# Altium footprint library SparkFun.PCBLIB: 674 footprints (part 12 of 44)
Each footprint in its own frame and in the unit in brackets; x right, y up, seen from the top. Pads: shape width x height; smd on the part's side, far side on the other; paste and mask are expansions set on the pad; w line width, h text height; cw(c..) or ccw(c..) is an arc to the next point about the centre after c.
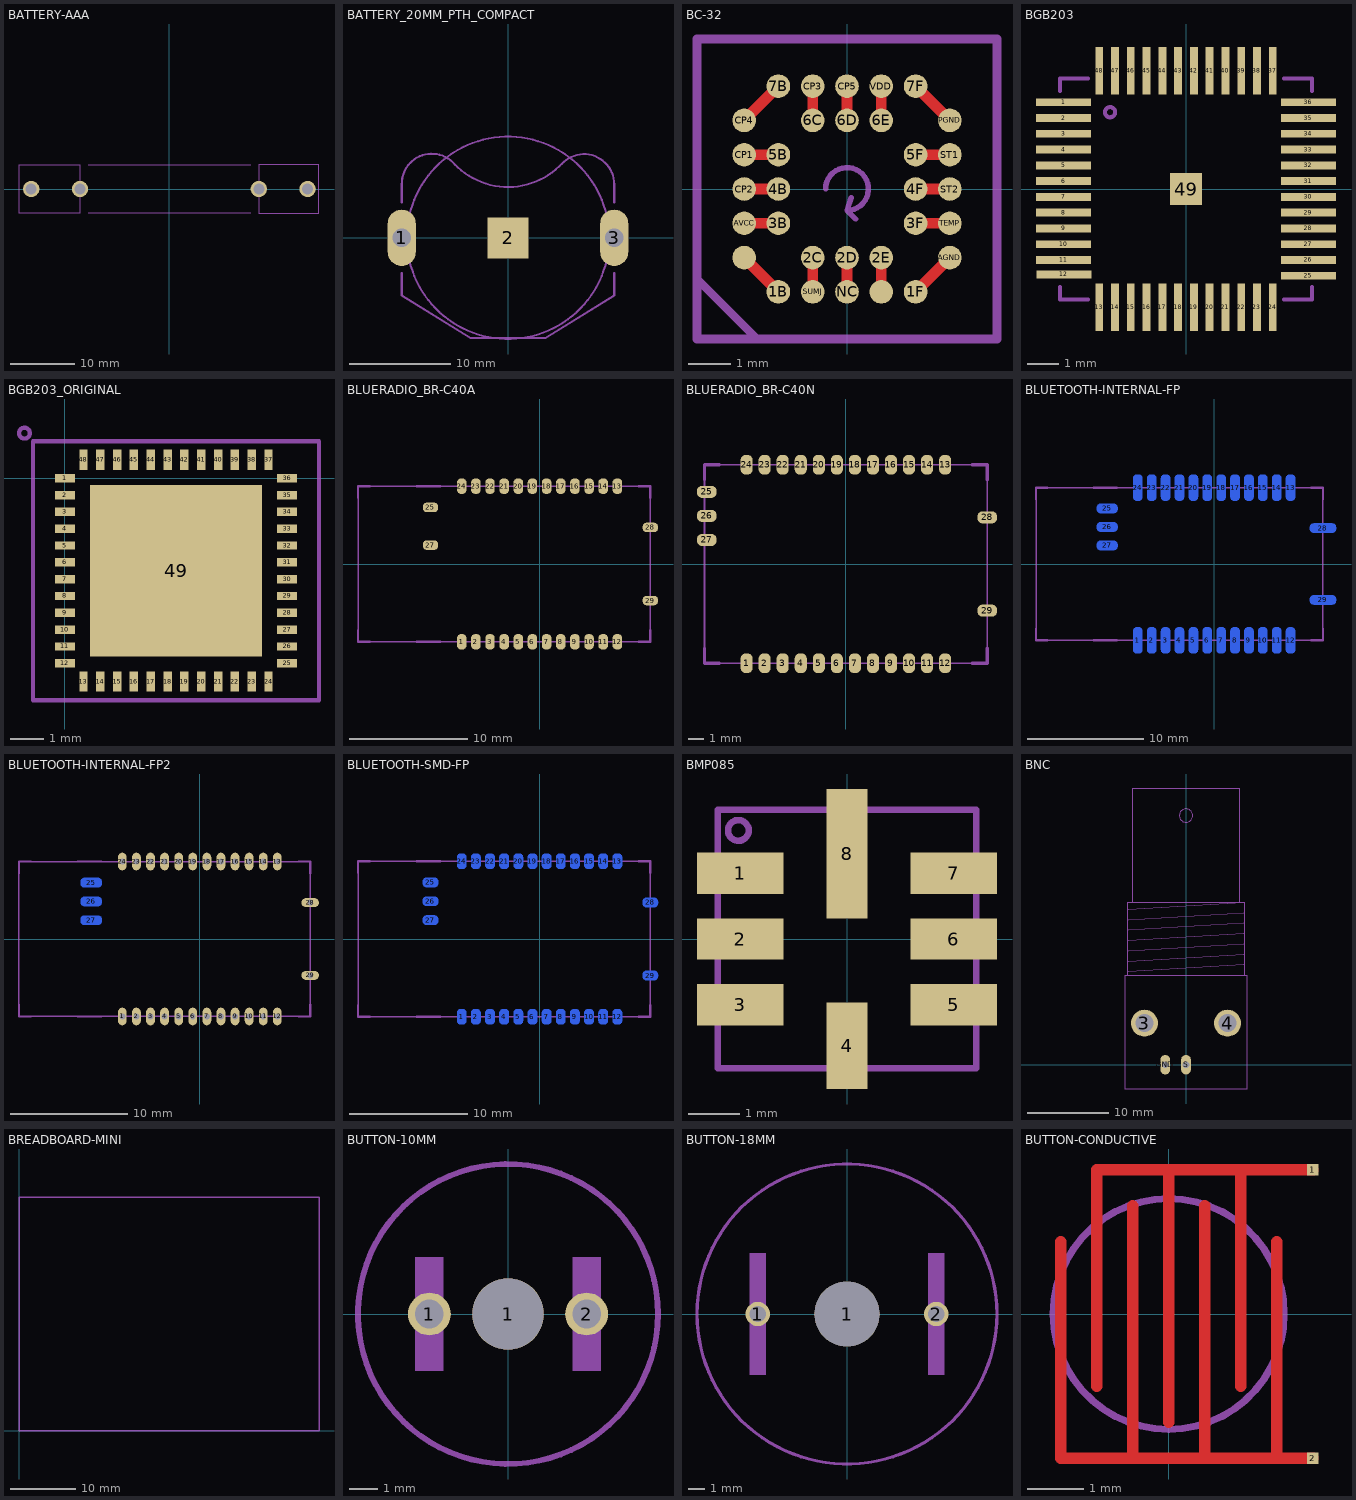
[diagram p11: the footprints below, top view; thin cyan lines are the x and y axes]

## BATTERY-AAA [mil]
pads (4):
  round 100.5 hole 67: GND@1(850,0) GND@2(550,0) PWR@1(-850,0) PWR@2(-550,0)
Mechanical 18:
  lines w5: -500,-150 500,-150 ; -500,150 500,150 ; -925,-150 -550,-150 -550,150 -925,150 -925,-150 ; 550,-150 550,150 920,150 920,-150 550,-150

## BATTERY_20MM_PTH_COMPACT [mil]
pads (3):
  oval 109.5x219 hole 73: 1(-413.39,0) 3(413.39,0)
  rect 160x160 smd: 2(0,0)
Mechanical 2:
  lines w8: -413.39,-137.8 -413.39,-224.41 -145.67,-389.76 145.67,-389.76 413.39,-224.41 413.39,-137.8 ; -413.39,137.8 -413.39,208.66 cw(c-296.55,210.4) -208.66,287.4 ccw(c0.13,485.68) 212.6,291.34 ; 208.66,287.4 cw(c295.52,207.71) 413.39,208.66 413.39,137.8
Mechanical 18:
  circle w8: c0,0 r393.7

## BC-32 [mil]
pads (32):
  rrect100% 21.65x21.65 smd: 1B(-62.99,-94.49) 1F(62.99,-94.49) 2C(-31.5,-62.99) 2D(0,-62.99) 2E(31.5,-62.99) 3B(-62.99,-31.5) 3F(62.99,-31.5) 4B(-62.99,0) 4F(62.99,0) 5B(-62.99,31.5) 5F(62.99,31.5) 6C(-31.5,62.99) 6D(0,62.99) 6E(31.5,62.99) 7B(-62.99,94.49) 7F(62.99,94.49) AGND(94.49,-62.99) AVCC(-94.49,-31.5) CP1(-94.49,31.5) CP2(-94.49,0) CP3(-31.5,94.49) CP4(-94.49,62.99) CP5(0,94.49) NC(0,-94.49) PGND(94.49,62.99) RATEOUT(-94.49,-62.99) ST1(94.49,31.5) ST2(94.49,0) SUMJ(-31.5,-94.49) TEMP(94.49,-31.5) VDD(31.5,94.49) VRATIO(31.5,-94.49)
Top Layer:
  lines w10: -94.49,-62.99 -62.99,-94.49 ; -94.49,-31.5 -62.99,-31.5 ; -94.49,0 -62.99,0 ; -94.49,31.5 -62.99,31.5 ; -94.49,62.99 -62.99,94.49 ; -31.5,-94.49 -31.5,-62.99 ; -31.5,62.99 -31.5,94.49 ; 0,-94.49 0,-62.99 ; 0,62.99 0,94.49 ; 31.5,-96.46 31.5,-62.99 ; 31.5,62.99 31.5,96.46 ; 61.02,0 94.49,0 ; 62.99,-94.49 94.49,-62.99 ; 62.99,-31.5 94.49,-31.5 ; 62.99,31.5 94.49,31.5 ; 62.99,94.49 94.49,62.99
Mechanical 2:
  lines w8: -137.8,-82.68 -82.68,-137.8 -78.74,-137.8 ; -137.8,-82.68 -137.8,137.8 137.8,137.8 137.8,-137.8 -78.74,-137.8 ; -137.8,-82.68 -137.8,-137.8 -78.74,-137.8
Mechanical 18:
  lines w5: -19.69,0 cw(c0,0) 0,-19.69 ; 3.94,-7.87 0,-19.69 ; 7.87,-27.56 0,-19.69 ; -137.8,-137.8 -137.8,137.8 137.8,137.8 137.8,-137.8 -137.8,-137.8

## BGB203 [mm]
pads (49):
  rect 1.75x0.25 smd: 1(-3.88,2.75) 2(-3.88,2.25) 3(-3.88,1.75) 4(-3.88,1.25) 5(-3.88,0.75) 6(-3.88,0.25) 7(-3.88,-0.25) 8(-3.88,-0.75) 9(-3.88,-1.25) 10(-3.88,-1.75) 11(-3.88,-2.25) 12(-3.87,-2.71) 25(3.88,-2.75) 26(3.88,-2.25) 27(3.88,-1.75) 28(3.88,-1.25) 29(3.88,-0.75) 30(3.88,-0.25) 31(3.88,0.25) 32(3.88,0.75) 33(3.88,1.25) 34(3.88,1.75) 35(3.88,2.25) 36(3.88,2.75)
  rect 0.25x1.5 smd: 13(-2.75,-3.75) 14(-2.25,-3.75) 15(-1.75,-3.75) 16(-1.25,-3.75) 17(-0.75,-3.75) 18(-0.25,-3.75) 19(0.25,-3.75) 20(0.75,-3.75) 21(1.25,-3.75) 22(1.75,-3.75) 23(2.25,-3.75) 24(2.75,-3.75) 37(2.75,3.75) 38(2.25,3.75) 39(1.75,3.75) 40(1.25,3.75) 41(0.75,3.75) 42(0.25,3.75) 43(-0.25,3.75) 44(-0.75,3.75) 45(-1.25,3.75) 46(-1.75,3.75) 47(-2.25,3.75) 48(-2.75,3.75)
  rect 1x1 smd paste-0.5: 49(0,0)
Top Paste:
  rectangle: -0.5,-0.5 0.5,0.5
Mechanical 2:
  circle w0.127: c-2.407,2.434 r0.161
  lines w0.127: -4,-3.1 -4,-3.5 -3.1,-3.5 ; -4,3.1 -4,3.5 -3.1,3.5 ; 3.1,-3.5 4,-3.5 4,-3.1 ; 3.1,3.5 4,3.5 4,3.1

## BGB203_ORIGINAL [mm]
pads (49):
  rect 0.6x0.25 smd mask-0.3: 1(0,0) 2(0,-0.5) 3(0,-1) 4(0,-1.5) 5(0,-2) 6(0,-2.5) 7(0,-3) 8(0,-3.5) 9(0,-4) 10(0,-4.5) 11(0,-5) 12(0,-5.5) 25(6.6,-5.5) 26(6.6,-5) 27(6.6,-4.5) 28(6.6,-4) 29(6.6,-3.5) 30(6.6,-3) 31(6.6,-2.5) 32(6.6,-2) 33(6.6,-1.5) 34(6.6,-1) 35(6.6,-0.5) 36(6.6,0)
  rect 0.25x0.6 smd mask-0.3: 13(0.55,-6.045) 14(1.05,-6.045) 15(1.55,-6.045) 16(2.05,-6.045) 17(2.55,-6.045) 18(3.05,-6.045) 19(3.55,-6.045) 20(4.05,-6.045) 21(4.55,-6.045) 22(5.05,-6.045) 23(5.55,-6.045) 24(6.05,-6.045) 37(6.05,0.55) 38(5.55,0.55) 39(5.05,0.55) 40(4.55,0.55) 41(4.05,0.55) 42(3.55,0.55) 43(3.05,0.55) 44(2.55,0.55) 45(2.05,0.55) 46(1.55,0.55) 47(1.05,0.55) 48(0.55,0.55)
  rect 5.1x5.1 smd paste-2.55 mask-2.55: 49(3.3,-2.75)
Top Paste:
  region: 0,0 0.254,0 0.254,0.254 0,0.254
  region: 0,0 0.254,0 0.254,0.254 0,0.254
  region: 0,0 0.254,0 0.254,0.254 0,0.254
  region: 0,0 0.254,0 0.254,0.254 0,0.254
Top Solder:
  drawing of 49 lines, arcs and shapes, not listed
Mechanical 2:
  circle w0.127: c-1.205,1.34 r0.161
  lines w0.127: -0.95,-6.595 -0.95,1.095 ; -0.95,1.1 7.55,1.1 7.55,0.3 ; -0.94,-6.595 7.55,-6.595 ; 7.55,-6.6 7.55,-6.595 ; 7.55,0.29 7.55,-6.595

## BLUERADIO_BR-C40A [mil]
pads (28):
  rrect80% 31.5x51.18 smd: 1(-259.84,-259.84) 2(-212.6,-259.84) 3(-165.35,-259.84) 4(-118.11,-259.84) 5(-70.87,-259.84) 6(-23.62,-259.84) 7(23.62,-259.84) 8(70.87,-259.84) 9(118.11,-259.84) 10(165.35,-259.84) 11(212.6,-259.84) 12(259.84,-259.84) 13(259.84,259.84) 14(212.6,259.84) 15(165.35,259.84) 16(118.11,259.84) 17(70.87,259.84) 18(23.62,259.84) 19(-23.62,259.84) 20(-70.87,259.84) 21(-118.11,259.84) 22(-165.35,259.84) 23(-212.6,259.84) 24(-259.84,259.84)
  rrect80% 51.18x31.5 smd: 25(-364.17,188.98) 27(-364.17,62.99) 28(370.08,122.05) 29(370.08,-122.05)
Mechanical 2:
  lines w8: -606.3,-220.47 -606.3,-259.84 -566.93,-259.84 ; -606.3,220.47 -606.3,259.84 -566.93,259.84 ; -409.45,-259.84 -370.08,-259.84 -330.71,-259.84 ; -409.45,259.84 -370.08,259.84 -330.71,259.84 ; 330.71,-259.84 370.08,-259.84 370.08,-220.47 ; 330.71,259.84 370.08,259.84 370.08,220.47
Mechanical 18:
  lines w5: -606.3,-259.84 -606.3,259.84 -370.08,259.84 370.08,259.84 370.08,-259.84 -370.08,-259.84 -606.3,-259.84

## BLUERADIO_BR-C40N [mil]
pads (29):
  rrect80% 31.5x51.18 smd: 1(-259.84,-259.84) 2(-212.6,-259.84) 3(-165.35,-259.84) 4(-118.11,-259.84) 5(-70.87,-259.84) 6(-23.62,-259.84) 7(23.62,-259.84) 8(70.87,-259.84) 9(118.11,-259.84) 10(165.35,-259.84) 11(212.6,-259.84) 12(259.84,-259.84) 13(259.84,259.84) 14(212.6,259.84) 15(165.35,259.84) 16(118.11,259.84) 17(70.87,259.84) 18(23.62,259.84) 19(-23.62,259.84) 20(-70.87,259.84) 21(-118.11,259.84) 22(-165.35,259.84) 23(-212.6,259.84) 24(-259.84,259.84)
  rrect80% 51.18x31.5 smd: 25(-364.17,188.98) 26(-364.17,125.98) 27(-364.17,62.99) 28(370.08,122.05) 29(370.08,-122.05)
Mechanical 2:
  lines w8: -370.08,-220.47 -370.08,-259.84 -330.71,-259.84 ; -370.08,220.47 -370.08,259.84 -330.71,259.84 ; 330.71,-259.84 370.08,-259.84 370.08,-220.47 ; 330.71,259.84 370.08,259.84 370.08,220.47
Mechanical 18:
  lines w5: -370.08,-259.84 370.08,-259.84 370.08,259.84 -370.08,259.84 -370.08,-259.84

## BLUETOOTH-INTERNAL-FP [mil]
pads (29):
  rrect80% 31.5x88.58 smd far side: 1(-259.84,-259.84) 2(-212.6,-259.84) 3(-165.35,-259.84) 4(-118.11,-259.84) 5(-70.87,-259.84) 6(-23.62,-259.84) 7(23.62,-259.84) 8(70.87,-259.84) 9(118.11,-259.84) 10(165.35,-259.84) 11(212.6,-259.84) 12(259.84,-259.84) 13(259.84,259.84) 14(212.6,259.84) 15(165.35,259.84) 16(118.11,259.84) 17(70.87,259.84) 18(23.62,259.84) 19(-23.62,259.84) 20(-70.87,259.84) 21(-118.11,259.84) 22(-165.35,259.84) 23(-212.6,259.84) 24(-259.84,259.84)
  rrect80% 70.87x31.5 smd far side: 25(-364.17,188.98) 26(-364.17,125.98) 27(-364.17,62.99)
  rrect80% 88.58x31.5 smd far side: 28(370.08,122.05) 29(370.08,-122.05)
Mechanical 2:
  lines w8: -606.3,-220.47 -606.3,-259.84 -566.93,-259.84 ; -606.3,220.47 -606.3,259.84 -566.93,259.84 ; -409.45,-259.84 -330.71,-259.84 ; -409.45,259.84 -330.71,259.84 ; 330.71,-259.84 370.08,-259.84 370.08,-220.47 ; 330.71,259.84 370.08,259.84 370.08,220.47
Mechanical 18:
  lines w5: -606.3,-259.84 -606.3,259.84 370.08,259.84 370.08,-259.84 -606.3,-259.84

## BLUETOOTH-INTERNAL-FP2 [mm]
pads (29):
  oval 0.75x1.5 hole 0.5: 1(-6.6,-6.6) 2(-5.4,-6.6) 3(-4.2,-6.6) 4(-3,-6.6) 5(-1.8,-6.6) 6(-0.6,-6.6) 7(0.6,-6.6) 8(1.8,-6.6) 9(3,-6.6) 10(4.2,-6.6) 11(5.4,-6.6) 12(6.6,-6.6) 13(6.6,6.6) 14(5.4,6.6) 15(4.2,6.6) 16(3,6.6) 17(1.8,6.6) 18(0.6,6.6) 19(-0.6,6.6) 20(-1.8,6.6) 21(-3,6.6) 22(-4.2,6.6) 23(-5.4,6.6) 24(-6.6,6.6)
  rrect80% 1.8x0.8 smd far side: 25(-9.25,4.8) 26(-9.25,3.2) 27(-9.25,1.6)
  oval 1.5x0.75 hole 0.5: 28(9.4,3.1) 29(9.4,-3.1)
Mechanical 2:
  lines w0.203: -15.4,-5.6 -15.4,-6.6 -14.4,-6.6 ; -15.4,5.6 -15.4,6.6 -14.4,6.6 ; -10.4,-6.6 -8.4,-6.6 ; -10.4,6.6 -8.4,6.6 ; 8.4,-6.6 9.4,-6.6 9.4,-5.6 ; 8.4,6.6 9.4,6.6 9.4,5.6
Mechanical 18:
  lines w0.127: -15.4,-6.6 -15.4,6.6 9.4,6.6 9.4,-6.6 -15.4,-6.6

## BLUETOOTH-SMD-FP [mil]
pads (29):
  rrect80% 31.5x51.18 smd far side: 1(-259.84,-259.84) 2(-212.6,-259.84) 3(-165.35,-259.84) 4(-118.11,-259.84) 5(-70.87,-259.84) 6(-23.62,-259.84) 7(23.62,-259.84) 8(70.87,-259.84) 9(118.11,-259.84) 10(165.35,-259.84) 11(212.6,-259.84) 12(259.84,-259.84) 13(259.84,259.84) 14(212.6,259.84) 15(165.35,259.84) 16(118.11,259.84) 17(70.87,259.84) 18(23.62,259.84) 19(-23.62,259.84) 20(-70.87,259.84) 21(-118.11,259.84) 22(-165.35,259.84) 23(-212.6,259.84) 24(-259.84,259.84)
  rrect80% 51.18x31.5 smd far side: 25(-364.17,188.98) 26(-364.17,125.98) 27(-364.17,62.99) 28(370.08,122.05) 29(370.08,-122.05)
Mechanical 2:
  lines w8: -606.3,-220.47 -606.3,-259.84 -566.93,-259.84 ; -606.3,220.47 -606.3,259.84 -566.93,259.84 ; -409.45,-259.84 -330.71,-259.84 ; -409.45,259.84 -330.71,259.84 ; 330.71,-259.84 370.08,-259.84 370.08,-220.47 ; 330.71,259.84 370.08,259.84 370.08,220.47
Mechanical 18:
  lines w5: -606.3,-259.84 -606.3,259.84 370.08,259.84 370.08,-259.84 -606.3,-259.84

## BMP085 [mil]
pads (8):
  rect 65.75x31.5 smd: 1(-81.3,50) 2(-81.3,0) 3(-81.3,-50) 5(81.3,-50) 6(81.3,0) 7(81.3,50)
  rect 31.5x65.75 smd: 4(0,-81.3)
  rect 31.5x98.43 smd: 8(0,64.96)
Mechanical 2:
  circle w5: c-82.68,82.68 r7.87
  lines w5: -98.43,-74.8 -98.43,-98.43 -70.87,-98.43 ; -98.43,74.8 -98.43,98.43 -74.8,98.43 ; 70.87,-98.43 98.43,-98.43 98.43,-74.8 ; 74.8,98.43 98.43,98.43 98.43,74.8
Mechanical 18:
  lines w5: -98.43,-98.43 98.43,-98.43 98.43,98.43 -98.43,98.43 -98.43,-98.43

## BNC [mil]
pads (4):
  round 129.91 hole 86.61: 3(-200,200) 4(200,200)
  oval 47.25x94.5 hole 31.5: GND(-100,0) S(0,0)
Mechanical 2:
  lines w5: -295,-117 295,-117 295,428 -295,428 -295,-117
Mechanical 18:
  circle w5: c0,1200 r32.2
  lines w5: -280,428 -280,783 -260,783 ; -279,449 279,483 ; -279,499 279,533 ; -279,549 279,583 ; -279,599 279,633 ; -279,649 279,683 ; -279,699 279,733 ; -279,749 279,783 ; 280,428 280,783 279,783 ; -260,783 260,783 ; -260,783 -260,1328 260,1328 260,783 ; 260,783 279,783

## BREADBOARD-MINI [mil]
Mechanical 2:
  lines w8: 0,0 0,1400 1800,1400 1800,0 0,0

## BUTTON-10MM [mm]
pads (3):
  round 1.5 hole 1: 1(-2.75,0) 2(2.75,0)
  round 2.5 hole 2.5: 1(0,0)
Mechanical 2:
  circle w0.203: c0,0 r5.25
Mechanical 13:
  rectangle: -3.25,-2 -2.25,2
  rectangle: 2.25,-2 3.25,2
Pad Holes:
  rectangle: -4,-2.75 -1.5,2.75
  rectangle: 1.5,-2.75 4,2.75

## BUTTON-18MM [mm]
pads (3):
  round 1.5 hole 1: 1(-5.5,0) 2(5.5,0)
  round 4 hole 4: 1(0,0)
Mechanical 2:
  circle w0.203: c0,0 r9.25
Mechanical 13:
  rectangle: -6,-3.75 -5,3.75
  rectangle: 5,-3.75 6,3.75
Pad Holes:
  rectangle: -7,-5 -4,5
  rectangle: 4,-5 7,5

## BUTTON-CONDUCTIVE [mil]
pads (2):
  rect 8x8 smd paste-4 mask-4: 1(100,100) 2(100,-100)
Top Layer:
  lines w8: -75,50 -75,-100 100,-100 ; -50,-50 -50,100 100,100 ; -25,-100 -25,75 ; 0,-75 0,100 ; 25,-100 25,75 ; 50,-50 50,100 ; 75,-100 75,50
Top Solder:
  circle w78.74: c0,0 r39.37
Mechanical 18:
  circle w5: c0,0 r80